# Altium footprint library IC.PcbLib: 386 footprints (part 18 of 30)
Each footprint in its own frame and in the unit in brackets; x right, y up, seen from the top. Pads: shape width x height; smd on the part's side, far side on the other; paste and mask are expansions set on the pad; w line width, h text height; cw(c..) or ccw(c..) is an arc to the next point about the centre after c.
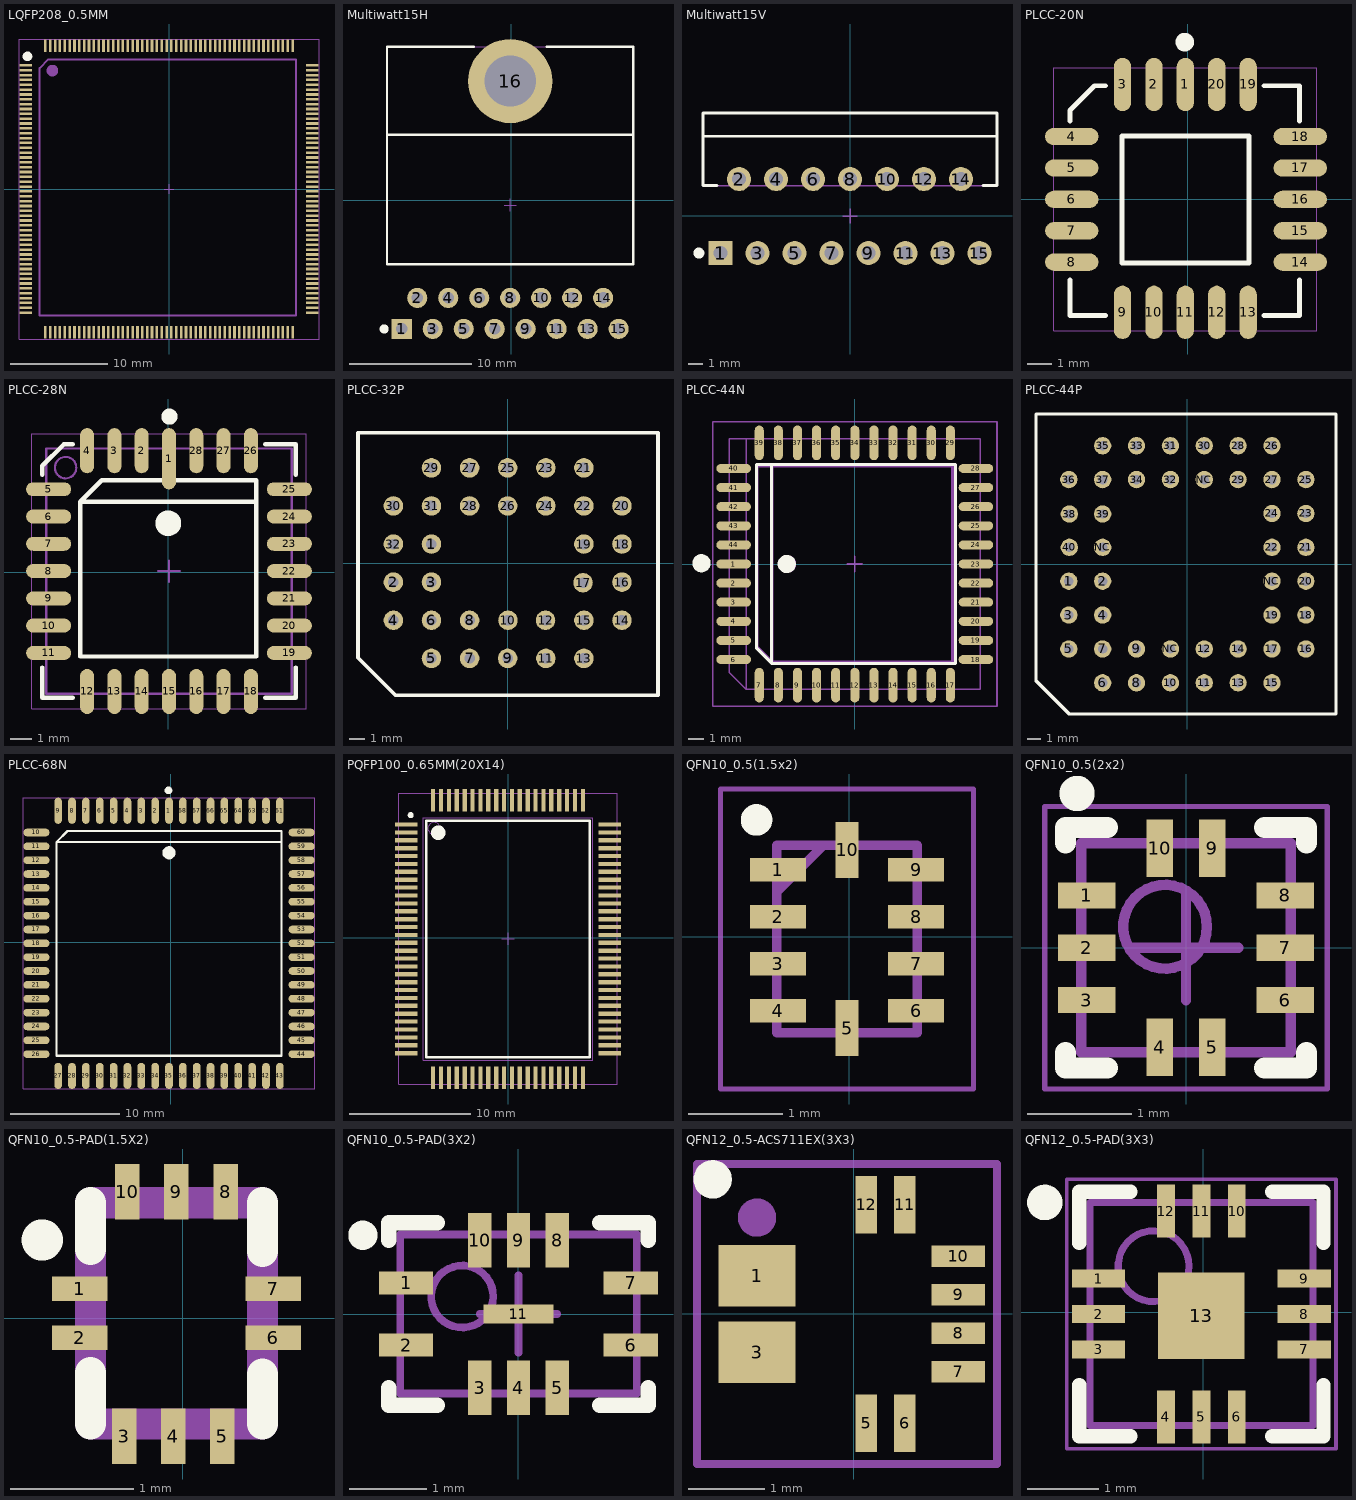
[diagram p17: the footprints below, top view; thin cyan lines are the x and y axes]

## LQFP208_0.5MM [mm]
height 0.254
pads (208):
  rect 1.3x0.27 smd: 1(-14.752,12.75) 2(-14.752,12.25) 3(-14.752,11.75) 4(-14.752,11.25) 5(-14.752,10.75) 6(-14.752,10.25) 7(-14.752,9.75) 8(-14.752,9.25) 9(-14.752,8.75) 10(-14.752,8.25) 11(-14.752,7.75) 12(-14.752,7.25) 13(-14.752,6.75) 14(-14.752,6.25) 15(-14.752,5.75) 16(-14.752,5.25) 17(-14.752,4.75) 18(-14.752,4.25) 19(-14.752,3.75) 20(-14.752,3.25) 21(-14.752,2.75) 22(-14.752,2.25) 23(-14.752,1.75) 24(-14.752,1.25) 25(-14.752,0.75) 26(-14.752,0.25) 27(-14.752,-0.25) 28(-14.752,-0.75) 29(-14.752,-1.25) 30(-14.752,-1.75) 31(-14.752,-2.25) 32(-14.752,-2.75) 33(-14.752,-3.25) 34(-14.752,-3.75) 35(-14.752,-4.25) 36(-14.752,-4.75) 37(-14.752,-5.25) 38(-14.752,-5.75) 39(-14.752,-6.25) 40(-14.752,-6.75) 41(-14.752,-7.25) 42(-14.752,-7.75) 43(-14.752,-8.25) 44(-14.752,-8.75) 45(-14.752,-9.25) 46(-14.752,-9.75) 47(-14.752,-10.25) 48(-14.752,-10.75) 49(-14.752,-11.25) 50(-14.752,-11.75) 51(-14.752,-12.25) 52(-14.752,-12.75) 105(14.752,-12.75) 106(14.752,-12.25) 107(14.752,-11.75) 108(14.752,-11.25) 109(14.752,-10.75) 110(14.752,-10.25) 111(14.752,-9.75) 112(14.752,-9.25) 113(14.752,-8.75) 114(14.752,-8.25) 115(14.752,-7.75) 116(14.752,-7.25) 117(14.752,-6.75) 118(14.752,-6.25) 119(14.752,-5.75) 120(14.752,-5.25) 121(14.752,-4.75) 122(14.752,-4.25) 123(14.752,-3.75) 124(14.752,-3.25) 125(14.752,-2.75) 126(14.752,-2.25) 127(14.752,-1.75) 128(14.752,-1.25) 129(14.752,-0.75) 130(14.752,-0.25) 131(14.752,0.25) 132(14.752,0.75) 133(14.752,1.25) 134(14.752,1.75) 135(14.752,2.25) 136(14.752,2.75) 137(14.752,3.25) 138(14.752,3.75) 139(14.752,4.25) 140(14.752,4.75) 141(14.752,5.25) 142(14.752,5.75) 143(14.752,6.25) 144(14.752,6.75) 145(14.752,7.25) 146(14.752,7.75) 147(14.752,8.25) 148(14.752,8.75) 149(14.752,9.25) 150(14.752,9.75) 151(14.752,10.25) 152(14.752,10.75) 153(14.752,11.25) 154(14.752,11.75) 155(14.752,12.25) 156(14.752,12.75)
  rect 0.27x1.3 smd: 53(-12.75,-14.752) 54(-12.25,-14.752) 55(-11.75,-14.752) 56(-11.25,-14.752) 57(-10.75,-14.752) 58(-10.25,-14.752) 59(-9.75,-14.752) 60(-9.25,-14.752) 61(-8.75,-14.752) 62(-8.25,-14.752) 63(-7.75,-14.752) 64(-7.25,-14.752) 65(-6.75,-14.752) 66(-6.25,-14.752) 67(-5.75,-14.752) 68(-5.25,-14.752) 69(-4.75,-14.752) 70(-4.25,-14.752) 71(-3.75,-14.752) 72(-3.25,-14.752) 73(-2.75,-14.752) 74(-2.25,-14.752) 75(-1.75,-14.752) 76(-1.25,-14.752) 77(-0.75,-14.752) 78(-0.25,-14.752) 79(0.25,-14.752) 80(0.75,-14.752) 81(1.25,-14.752) 82(1.75,-14.752) 83(2.25,-14.752) 84(2.75,-14.752) 85(3.25,-14.752) 86(3.75,-14.752) 87(4.25,-14.752) 88(4.75,-14.752) 89(5.25,-14.752) 90(5.75,-14.752) 91(6.25,-14.752) 92(6.75,-14.752) 93(7.25,-14.752) 94(7.75,-14.752) 95(8.25,-14.752) 96(8.75,-14.752) 97(9.25,-14.752) 98(9.75,-14.752) 99(10.25,-14.752) 100(10.75,-14.752) 101(11.25,-14.752) 102(11.75,-14.752) 103(12.25,-14.752) 104(12.75,-14.752) 157(12.75,14.752) 158(12.25,14.752) 159(11.75,14.752) 160(11.25,14.752) 161(10.75,14.752) 162(10.25,14.752) 163(9.75,14.752) 164(9.25,14.752) 165(8.75,14.752) 166(8.25,14.752) 167(7.75,14.752) 168(7.25,14.752) 169(6.75,14.752) 170(6.25,14.752) 171(5.75,14.752) 172(5.25,14.752) 173(4.75,14.752) 174(4.25,14.752) 175(3.75,14.752) 176(3.25,14.752) 177(2.75,14.752) 178(2.25,14.752) 179(1.75,14.752) 180(1.25,14.752) 181(0.75,14.752) 182(0.25,14.752) 183(-0.25,14.752) 184(-0.75,14.752) 185(-1.25,14.752) 186(-1.75,14.752) 187(-2.25,14.752) 188(-2.75,14.752) 189(-3.25,14.752) 190(-3.75,14.752) 191(-4.25,14.752) 192(-4.75,14.752) 193(-5.25,14.752) 194(-5.75,14.752) 195(-6.25,14.752) 196(-6.75,14.752) 197(-7.25,14.752) 198(-7.75,14.752) 199(-8.25,14.752) 200(-8.75,14.752) 201(-9.25,14.752) 202(-9.75,14.752) 203(-10.25,14.752) 204(-10.75,14.752) 205(-11.25,14.752) 206(-11.75,14.752) 207(-12.25,14.752) 208(-12.75,14.752)
Top Overlay:
  circle w0.5: c-14.6,13.678 r0.25
Mechanical 15:
  circle w0.6: c-12.023,12.206 r0.3
  lines w0.1: -0.5,0 0.5,0 ; 0,-0.5 0,0.5 ; -15.469,-15.469 15.469,-15.469 15.469,15.469 -15.469,15.469 -15.469,-15.469
  lines w0.2: -13.335,-13.056 13.081,-13.056 13.081,13.36 -12.441,13.36 -13.335,12.466 -13.335,-13.056
3D body "LQFP208-0.5mm.STEP": height 1.4, standoff 0, extent -14.75,-14.75 14.75,14.75

## Multiwatt15H [mm]
pads (16):
  rect 1.65x1.65 hole 0.95: 1(-8.992,-10.541)
  round 1.65 hole 0.95: 2(-7.722,-8.001) 3(-6.452,-10.541) 4(-5.182,-8.001) 5(-3.912,-10.541) 6(-2.642,-8.001) 7(-1.372,-10.541) 8(-0.102,-8.001) 9(1.168,-10.541) 10(2.438,-8.001) 11(3.708,-10.541) 12(4.978,-8.001) 13(6.248,-10.541) 14(7.518,-8.001) 15(8.788,-10.541)
  round 6.9 hole 4.2: 16(-0.102,9.779)
Top Overlay:
  circle w0.5: c-10.439,-10.541 r0.125
  lines w0.2: -10.202,5.379 9.998,5.379 ; -3.102,12.579 -10.202,12.579 -10.202,-5.221 9.998,-5.221 9.998,12.579 2.898,12.579
Mechanical 13:
  circle w0.1: c-0.102,9.779 r1.925
  lines w0.1: -10.202,5.379 9.998,5.379 ; -10.202,-5.221 9.998,-5.221 9.998,12.579 -10.202,12.579 -10.202,-5.221
Mechanical 15:
  lines w0.1: -0.602,-0.381 0.398,-0.381 ; -0.102,-0.881 -0.102,0.119
3D body "User Library-Multiwatt15H.step": height 5.1, standoff -1.4, extent -9.952,-10.82 9.648,12.78
3D body: height 1.6, standoff 0, extent -2.026,7.855 1.823,11.703

## Multiwatt15V [mm]
pads (15):
  rect 1.65x1.65 hole 0.95: 1(-8.89,-2.565)
  round 1.65 hole 0.95: 2(-7.62,2.515) 3(-6.35,-2.565) 4(-5.08,2.515) 5(-3.81,-2.565) 6(-2.54,2.515) 7(-1.27,-2.565) 8(0,2.515) 9(1.27,-2.565) 10(2.54,2.515) 11(3.81,-2.565) 12(5.08,2.515) 13(6.35,-2.565) 14(7.62,2.515) 15(8.89,-2.565)
Top Overlay:
  circle w0.5: c-10.389,-2.565 r0.125
  lines w0.2: -10.1,5.465 10.1,5.465 ; -9.144,2.065 -10.1,2.065 -10.1,7.065 10.1,7.065 10.1,2.065 9.144,2.065
Mechanical 13:
  lines w0.1: -10.1,5.465 10.1,5.465 ; -10.1,2.065 -10.1,7.065 10.1,7.065 10.1,2.065 -10.1,2.065
Mechanical 15:
  lines w0.1: -0.5,-0.025 0.5,-0.025 ; 0,-0.525 0,0.475
3D body "User Library-Multiwatt15V.step": height 21, standoff -1.3, extent -9.779,-2.794 9.821,7.096

## PLCC-20N [mil] "PLCC, 44-Leads, Body 17.6x17.6mm (max), Pitch 1.270mm, IPC Medium Density"
height 177.17
pads (20):
  rrect100% 27.56x84.96 smd: 1(-4,182.5) 2(-54,182.5) 3(-104,182.5) 9(-104,-180.5) 10(-54,-180.5) 11(-4,-180.5) 12(46,-180.5) 13(96,-180.5) 19(96,182.5) 20(46,182.5)
  rrect100% 84.96x27.56 smd: 4(-185,99.5) 5(-185,49.5) 6(-185,-0.5) 7(-185,-50.5) 8(-185,-100.5) 14(179,-100.5) 15(179,-50.5) 16(179,-0.5) 17(179,49.5) 18(179,99.5)
Top Overlay:
  circle w19.68: c-5,250 r4.92
  lines w7.87: -188.07,-129.16 -188.07,-185.65 -131.57,-185.65 ; -188.07,123.99 -188.07,141.12 -148.7,180.49 -131.57,180.49 ; 121.57,-185.65 178.07,-185.65 178.07,-129.16 ; 121.57,180.49 178.07,180.49 178.07,123.99 ; -105.1,-101.6 -105.1,100.6 97.1,100.6 97.1,-101.6 -105.1,-101.6
Mechanical 15:
  lines w1.97: -213.65,-210.15 -213.65,209.15 205.65,209.15 205.65,-210.15 -213.65,-210.15
3D body "User Library-PLCC-20.step": height 190.55, standoff 3.15, extent -200.84,-198 192.85,195.7

## PLCC-28N [mm]
height 4.5
pads (28):
  oval 0.65x2.85 smd: 1(0.034,5.28)
  oval 0.65x2.1 smd: 2(-1.236,5.655) 3(-2.506,5.655) 4(-3.776,5.655) 12(-3.776,-5.554) 13(-2.506,-5.554) 14(-1.236,-5.554) 15(0.034,-5.554) 16(1.304,-5.554) 17(2.574,-5.554) 18(3.844,-5.554) 26(3.844,5.655) 27(2.574,5.655) 28(1.304,5.655)
  oval 2.1x0.65 smd: 5(-5.57,3.861) 6(-5.57,2.591) 7(-5.57,1.321) 8(-5.57,0.051) 9(-5.57,-1.219) 10(-5.57,-2.489) 11(-5.57,-3.759) 19(5.639,-3.759) 20(5.639,-2.489) 21(5.639,-1.219) 22(5.639,0.051) 23(5.639,1.321) 24(5.639,2.591) 25(5.639,3.861)
Top Overlay:
  circle w0.5: c0.051,7.239 r0.125
  circle w0.6: c0,2.278 r0.3
  lines w0.2: -5.866,-4.434 -5.866,-5.849 -4.451,-5.849 ; -5.866,4.536 -5.866,4.951 -4.866,5.951 -4.451,5.951 ; 4.1,3.278 -4.1,3.278 ; 4.519,-5.849 5.934,-5.849 5.934,-4.434 ; 4.519,5.951 5.934,5.951 5.934,4.536 ; -4.1,3.278 -4.1,-3.922 4.1,-3.922 4.1,4.278 -3.1,4.278 -4.1,3.278
Mechanical 13:
  circle w0.1: c-4.781,4.866 r0.5
  lines w0.1: -5.681,-5.664 5.749,-5.664 5.749,5.766 -5.681,5.766 -5.681,-5.664
Mechanical 15:
  lines w0.05: -6.366,-6.349 6.434,-6.349 6.434,6.451 -6.366,6.451 -6.366,-6.349
  lines w0.1: -0.466,0.051 0.534,0.051 ; 0.034,-0.449 0.034,0.551
3D body "User Library-PLCC28.STEP": height 4.5, standoff 0, extent -6.21,-6.147 6.109,6.172

## PLCC-32P [mm]
pads (32):
  round 1.3 hole 0.7: 1(-5.08,1.27) 2(-7.62,-1.27) 3(-5.08,-1.27) 4(-7.62,-3.81) 5(-5.08,-6.35) 6(-5.08,-3.81) 7(-2.54,-6.35) 8(-2.54,-3.81) 9(0,-6.35) 10(0.02,-3.81) 11(2.54,-6.35) 12(2.52,-3.81) 13(5.08,-6.35) 14(7.62,-3.81) 15(5.08,-3.81) 16(7.62,-1.27) 17(5.02,-1.31) 18(7.62,1.27) 19(5.08,1.27) 20(7.62,3.81) 21(5.08,6.35) 22(5.08,3.81) 23(2.54,6.35) 24(2.54,3.81) 25(0,6.35) 26(0,3.81) 27(-2.54,6.35) 28(-2.54,3.81) 29(-5.08,6.35) 30(-7.62,3.81) 31(-5.08,3.81) 32(-7.62,1.27)
Top Overlay:
  lines w0.254: -9.98,-6.31 -9.98,-3.81 -9.98,8.69 10.02,8.69 10.02,-8.81 -4.98,-8.81 -7.48,-8.81 -9.98,-6.31
3D body "PLCC 32W.STEP": height 6.8, standoff -4.88, extent -9.904,-8.659 10.006,8.711

## PLCC-44N [mm] "PLCC, 44-Leads, Body 17.6x17.6mm (max), Pitch 1.270mm, IPC Medium Density"
height 4.5
pads (44):
  oval 2.3x0.6 smd: 1(-8.05,0) 2(-8.05,-1.27) 3(-8.05,-2.54) 4(-8.05,-3.81) 5(-8.05,-5.08) 6(-8.05,-6.35) 18(8.05,-6.35) 19(8.05,-5.08) 20(8.05,-3.81) 21(8.05,-2.54) 22(8.05,-1.27) 23(8.05,0) 24(8.05,1.27) 25(8.05,2.54) 26(8.05,3.81) 27(8.05,5.08) 28(8.05,6.35) 40(-8.05,6.35) 41(-8.05,5.08) 42(-8.05,3.81) 43(-8.05,2.54) 44(-8.05,1.27)
  oval 0.6x2.3 smd: 7(-6.35,-8.05) 8(-5.08,-8.05) 9(-3.81,-8.05) 10(-2.54,-8.05) 11(-1.27,-8.05) 12(0,-8.05) 13(1.27,-8.05) 14(2.54,-8.05) 15(3.81,-8.05) 16(5.08,-8.05) 17(6.35,-8.05) 29(6.35,8.05) 30(5.08,8.05) 31(3.81,8.05) 32(2.54,8.05) 33(1.27,8.05) 34(0,8.05) 35(-1.27,8.05) 36(-2.54,8.05) 37(-3.81,8.05) 38(-5.08,8.05) 39(-6.35,8.05)
Top Overlay:
  circle w0.6: c-4.524,0 r0.3
  circle w0.6: c-10.188,0.051 r0.3
  lines w0.2: -5.524,6.6 -5.524,-6.6 ; -5.524,-6.6 6.676,-6.6 6.676,6.6 -6.524,6.6 -6.524,-5.6 -5.524,-6.6
Mechanical 13:
  lines w0.1: -7.23,8.33 -7.23,-8.33 ; -7.23,-8.33 8.33,-8.33 8.33,8.33 -8.33,8.33 -8.33,-7.23 -7.23,-8.33
Mechanical 15:
  circle w0.6: c-4.5,0 r0.3
  lines w0.1: -0.5,0 0.5,0 ; 0,-0.5 0,0.5 ; -9.45,-9.45 9.45,-9.45 9.45,9.45 -9.45,9.45 -9.45,-9.45
  lines w0.2: -5.5,6.5 -5.5,-6.5 ; -5.5,-6.5 -6.5,-5.5 -6.5,6.5 6.5,6.5 6.5,-6.5 -5.5,-6.5
3D body "User Library-plcc-44p1658x1658ls127h439.step": height 4.39, standoff 0, extent -8.813,-8.686 8.712,8.839

## PLCC-44P [mm]
pads (44):
  round 1.3 hole 0.7: 1(-8.89,-1.27) 2(-6.35,-1.27) 3(-8.89,-3.81) 4(-6.35,-3.81) 5(-8.89,-6.35) 6(-6.35,-8.89) 7(-6.35,-6.35) 8(-3.81,-8.89) 9(-3.81,-6.35) 10(-1.27,-8.89) 11(1.27,-8.89) 12(1.27,-6.35) 13(3.81,-8.89) 14(3.81,-6.35) 15(6.35,-8.89) 16(8.89,-6.35) 17(6.35,-6.35) 18(8.89,-3.81) 19(6.35,-3.81) 20(8.89,-1.27) 21(8.89,1.27) 22(6.35,1.27) 23(8.89,3.81) 24(6.35,3.81) 25(8.89,6.35) 26(6.35,8.89) 27(6.35,6.35) 28(3.81,8.89) 29(3.81,6.35) 30(1.27,8.89) 31(-1.27,8.89) 32(-1.27,6.35) 33(-3.81,8.89) 34(-3.81,6.35) 35(-6.35,8.89) 36(-8.89,6.35) 37(-6.35,6.35) 38(-8.85,3.77) 39(-6.35,3.77) 40(-8.85,1.27) NC(-6.35,1.27) NC(-1.27,-6.35) NC(1.27,6.35) NC(6.35,-1.27)
Top Overlay:
  lines w0.254: -11.35,-8.73 -11.35,-6.23 -11.35,11.27 11.15,11.27 11.15,-11.23 -6.35,-11.23 -8.85,-11.23 -11.35,-8.73
3D body "a-ccs_044-z-t.stp": height 8, standoff -3.35, extent -11.786,-11.699 11.714,11.801

## PLCC-68N [mm]
height 4.5
pads (68):
  oval 0.7x2.4 smd: 1(-0.152,12.078) 2(-1.422,12.078) 3(-2.692,12.078) 4(-3.962,12.078) 5(-5.232,12.078) 6(-6.502,12.078) 7(-7.772,12.078) 8(-9.042,12.078) 9(-10.312,12.078) 27(-10.312,-12.23) 28(-9.042,-12.23) 29(-7.772,-12.23) 30(-6.502,-12.23) 31(-5.232,-12.23) 32(-3.962,-12.23) 33(-2.692,-12.23) 34(-1.422,-12.23) 35(-0.152,-12.23) 36(1.118,-12.23) 37(2.388,-12.23) 38(3.658,-12.23) 39(4.928,-12.23) 40(6.198,-12.23) 41(7.468,-12.23) 42(8.738,-12.23) 43(10.008,-12.23) 61(10.008,12.078) 62(8.738,12.078) 63(7.468,12.078) 64(6.198,12.078) 65(4.928,12.078) 66(3.658,12.078) 67(2.388,12.078) 68(1.118,12.078)
  oval 2.4x0.7 smd: 10(-12.306,10.084) 11(-12.306,8.814) 12(-12.306,7.544) 13(-12.306,6.274) 14(-12.306,5.004) 15(-12.306,3.734) 16(-12.306,2.464) 17(-12.306,1.194) 18(-12.306,-0.076) 19(-12.306,-1.346) 20(-12.306,-2.616) 21(-12.306,-3.886) 22(-12.306,-5.156) 23(-12.306,-6.426) 24(-12.306,-7.696) 25(-12.306,-8.966) 26(-12.306,-10.236) 44(12.002,-10.236) 45(12.002,-8.966) 46(12.002,-7.696) 47(12.002,-6.426) 48(12.002,-5.156) 49(12.002,-3.886) 50(12.002,-2.616) 51(12.002,-1.346) 52(12.002,-0.076) 53(12.002,1.194) 54(12.002,2.464) 55(12.002,3.734) 56(12.002,5.004) 57(12.002,6.274) 58(12.002,7.544) 59(12.002,8.814) 60(12.002,10.084)
Top Overlay:
  circle w0.6: c-0.152,8.224 r0.3
  circle w0.45: c-0.203,13.945 r0.125
  lines w0.2: 10.148,9.224 -10.452,9.224 ; -10.452,9.224 -10.452,-10.376 10.148,-10.376 10.148,10.224 -9.452,10.224 -10.452,9.224
Mechanical 15:
  lines w0.05: -13.502,-13.426 13.198,-13.426 13.198,13.274 -13.502,13.274 -13.502,-13.426
3D body "User Library-8051 MCU PLCC 68-pin package (1).step": height 4.38, standoff 0, extent -12.751,-12.7 12.395,12.446

## PQFP100_0.65MM(20X14) [mm]
pads (100):
  rect 1.85x0.35 smd: 1(-8.406,9.349) 2(-8.406,8.699) 3(-8.406,8.049) 4(-8.406,7.399) 5(-8.406,6.749) 6(-8.406,6.099) 7(-8.406,5.449) 8(-8.406,4.799) 9(-8.406,4.149) 10(-8.406,3.499) 11(-8.406,2.849) 12(-8.406,2.199) 13(-8.406,1.549) 14(-8.406,0.899) 15(-8.406,0.249) 16(-8.406,-0.401) 17(-8.406,-1.051) 18(-8.406,-1.701) 19(-8.406,-2.351) 20(-8.406,-3.001) 21(-8.406,-3.651) 22(-8.406,-4.301) 23(-8.406,-4.951) 24(-8.406,-5.601) 25(-8.406,-6.251) 26(-8.406,-6.901) 27(-8.406,-7.551) 28(-8.406,-8.201) 29(-8.406,-8.851) 30(-8.406,-9.501) 51(8.406,-9.501) 52(8.406,-8.851) 53(8.406,-8.201) 54(8.406,-7.551) 55(8.406,-6.901) 56(8.406,-6.251) 57(8.406,-5.601) 58(8.406,-4.951) 59(8.406,-4.301) 60(8.406,-3.651) 61(8.406,-3.001) 62(8.406,-2.351) 63(8.406,-1.701) 64(8.406,-1.051) 65(8.406,-0.401) 66(8.406,0.249) 67(8.406,0.899) 68(8.406,1.549) 69(8.406,2.199) 70(8.406,2.849) 71(8.406,3.499) 72(8.406,4.149) 73(8.406,4.799) 74(8.406,5.449) 75(8.406,6.099) 76(8.406,6.749) 77(8.406,7.399) 78(8.406,8.049) 79(8.406,8.699) 80(8.406,9.349)
  rect 0.35x1.85 smd: 31(-6.175,-11.533) 32(-5.525,-11.533) 33(-4.875,-11.533) 34(-4.225,-11.533) 35(-3.575,-11.533) 36(-2.925,-11.533) 37(-2.275,-11.533) 38(-1.625,-11.533) 39(-0.975,-11.533) 40(-0.325,-11.533) 41(0.325,-11.533) 42(0.975,-11.533) 43(1.625,-11.533) 44(2.275,-11.533) 45(2.925,-11.533) 46(3.575,-11.533) 47(4.225,-11.533) 48(4.875,-11.533) 49(5.525,-11.533) 50(6.175,-11.533) 81(6.175,11.355) 82(5.525,11.355) 83(4.875,11.355) 84(4.225,11.355) 85(3.575,11.355) 86(2.925,11.355) 87(2.275,11.355) 88(1.625,11.355) 89(0.975,11.355) 90(0.325,11.355) 91(-0.325,11.355) 92(-0.975,11.355) 93(-1.625,11.355) 94(-2.275,11.355) 95(-2.925,11.355) 96(-3.575,11.355) 97(-4.225,11.355) 98(-4.875,11.355) 99(-5.525,11.355) 100(-6.175,11.355)
Top Overlay:
  circle w0.25: c-8.025,10.124 r0.125
  circle w0.6: c-5.75,8.674 r0.3
  lines w0.2: -6.75,-9.826 -6.75,9.674 6.75,9.674 6.75,-9.826 -6.75,-9.826
Mechanical 13:
  circle w0.1: c-6.1,9.024 r0.5
  lines w0.1: -7,-10.076 -7,9.924 7,9.924 7,-10.076 -7,-10.076
Mechanical 15:
  lines w0.05: -9,-12.076 -9,11.924 9,11.924 9,-12.076 -9,-12.076
  lines w0.1: -0.5,-0.076 0.5,-0.076 ; 0,-0.576 0,0.424
3D body "User Library-QFP-100.STEP": height 3.45, standoff -0.08, extent -8.6,-11.659 8.6,11.541

## QFN10_0.5(1.5x2) [mm]
height 0.254
pads (10):
  rect 0.6x0.25 smd: 1(-0.762,0.711) 2(-0.762,0.211) 3(-0.762,-0.289) 4(-0.762,-0.789) 6(0.711,-0.789) 7(0.711,-0.289) 8(0.711,0.211) 9(0.711,0.711)
  rect 0.25x0.6 smd: 5(-0.025,-0.975) 10(-0.025,0.925)
Top Overlay:
  circle w0.25: c-0.991,1.245 r0.043
Mechanical 13:
  lines w0.1: -0.775,0.475 -0.275,0.975 ; -0.775,-1.025 -0.775,0.975 0.725,0.975 0.725,-1.025 -0.775,-1.025
Mechanical 15:
  lines w0.05: -1.375,-1.625 -1.375,1.575 1.325,1.575 1.325,-1.625 -1.375,-1.625
3D body "TS5A23159RSER.stp": height 0.6, standoff 0, extent -0.825,-1.075 0.775,1.025

## QFN10_0.5(2x2) [mm]
height 0.254
pads (10):
  rect 0.55x0.25 smd: 1(-0.95,0.5) 2(-0.95,0) 3(-0.95,-0.5) 6(0.95,-0.5) 7(0.95,0) 8(0.95,0.5)
  rect 0.25x0.55 smd: 4(-0.25,-0.95) 5(0.25,-0.95) 9(0.25,0.95) 10(-0.25,0.95)
Top Overlay:
  circle w0.25: c-1.041,1.473 r0.043
  lines w0.2: -1.15,-1 -1.15,-1.15 -0.75,-1.15 ; -1.15,1 -1.15,1.15 -0.75,1.15 ; 0.75,-1.15 1.15,-1.15 1.15,-1 ; 0.75,1.15 1.15,1.15 1.15,1
Mechanical 13:
  circle w0.1: c-0.2,0.2 r0.4
  lines w0.1: -1,-1 -1,1 1,1 1,-1 -1,-1
Mechanical 15:
  lines w0.05: -1.35,-1.35 -1.35,1.35 1.35,1.35 1.35,-1.35 -1.35,-1.35
  lines w0.1: -0.5,0 0.5,0 ; 0,-0.5 0,0.5
3D body: height 0.6, standoff 0, extent -1,-1 1,1
3D body: height 0.62, standoff 0.4, extent -0.861,0.508 -0.562,0.807

## QFN10_0.5-PAD(1.5X2) [mm]
height 0.254
pads (10):
  rect 0.45x0.2 smd: 1(-0.838,0.238) 2(-0.838,-0.162) 6(0.737,-0.162) 7(0.737,0.238)
  rect 0.2x0.45 smd: 3(-0.476,-0.964) 4(-0.076,-0.964) 5(0.324,-0.964) 8(0.349,1.029) 9(-0.051,1.029) 10(-0.451,1.029)
Top Overlay:
  circle w0.254: c-1.143,0.635 r0.041
  lines w0.254: -0.751,-0.862 -0.751,-0.446 ; -0.751,0.559 -0.751,0.938 ; 0.649,-0.862 0.649,-0.458 ; 0.649,0.542 0.649,0.938
Mechanical 13:
  lines w0.254: -0.751,-0.862 -0.751,0.938 0.649,0.938 0.649,-0.862 -0.751,-0.862
3D body: height 0.6, standoff 0, extent -0.762,-0.889 0.635,1.016
3D body: height 0.62, standoff 0.4, extent -0.581,0.356 -0.282,0.655

## QFN10_0.5-PAD(3X2) [mm]
height 0.254
pads (11):
  rect 0.7x0.3 smd: 1(-1.45,0.4) 2(-1.45,-0.4) 6(1.45,-0.4) 7(1.45,0.4)
  rect 0.3x0.7 smd: 3(-0.5,-0.95) 4(0,-0.95) 5(0.5,-0.95) 8(0.5,0.95) 9(0,0.95) 10(-0.5,0.95)
  rect 0.9x0.25 smd: 11(0,0)
Top Overlay:
  circle w0.25: c-2.007,1.016 r0.063
  lines w0.2: -1.675,-0.95 -1.675,-1.175 -1.05,-1.175 ; -1.675,0.95 -1.675,1.175 -1.05,1.175 ; 1.05,-1.175 1.675,-1.175 1.675,-0.95 ; 1.05,1.175 1.675,1.175 1.675,0.95
Mechanical 13:
  circle w0.1: c-0.725,0.225 r0.4
  lines w0.1: -1.525,-1.025 1.525,-1.025 1.525,1.025 -1.525,1.025 -1.525,-1.025
Mechanical 15:
  lines w0.1: -0.5,0 0.5,0 ; 0,-0.5 0,0.5
3D body: height 0.8, standoff 0, extent -1.525,-1.025 1.525,1.025
3D body: height 0.82, standoff 0.4, extent -1.342,0.562 -1.044,0.861

## QFN12_0.5-ACS711EX(3X3) [mm]
pads (10):
  rect 1x0.8 smd paste-2 mask+0.076: 1(-1.26,0.5) 3(-1.26,-0.5)
  rect 0.28x0.75 smd mask+0.076: 5(0.163,-1.425) 6(0.663,-1.425) 11(0.663,1.425) 12(0.163,1.425)
  rect 0.7x0.28 smd mask+0.051: 7(1.363,-0.75) 8(1.363,-0.25) 9(1.363,0.25) 10(1.363,0.75)
Top Overlay:
  circle w0.25: c-1.839,1.755 r0.125
Top Paste:
  lines w0.1: -1.666,-0.723 -1.067,-0.723 ; -1.666,-0.652 -0.998,-0.652 -0.963,-0.617 -0.963,-0.368 -1.135,-0.195 ; -1.666,-0.348 -0.998,-0.348 ; -1.666,-0.277 -1.067,-0.277 ; -1.666,0.277 -1.067,0.277 ; -1.666,0.348 -0.998,0.348 -0.963,0.383 -0.963,0.632 -1.135,0.805 ; -1.666,0.652 -0.998,0.652 ; -1.666,0.723 -1.067,0.723 ; -1.659,-0.424 -0.965,-0.424 ; -1.659,0.576 -0.965,0.576 ; -1.656,-0.5 -0.968,-0.5 ; -1.656,0.5 -0.968,0.5 ; -0.973,-0.576 -1.661,-0.576 -0.968,-0.576 ; -0.973,0.424 -1.661,0.424 -0.968,0.424 ; -0.963,-0.632 -1.135,-0.805 -1.666,-0.805 -1.666,-0.195 ; -0.963,0.368 -1.135,0.195 -1.666,0.195 -1.666,0.805 ; -1.666,-0.195 -1.135,-0.195 ; -1.666,-0.195 -1.135,-0.195 ; -1.666,0.805 -1.135,0.805 ; -1.666,0.805 -1.135,0.805
Mechanical 15:
  circle w0.25: c-1.26,1.257 r0.125
  lines w0.1: -2.043,-1.956 -2.043,1.956 1.868,1.956 1.868,-1.956 -2.043,-1.956
3D body: height 0.82, standoff 0.4, extent -1.215,1.044 -0.917,1.344
3D body: height 0.8, standoff 0, extent -1.452,-1.551 1.402,1.499

## QFN12_0.5-PAD(3X3) [mm]
height 0.254
pads (13):
  rect 0.75x0.25 smd: 1(-1.477,0.475) 2(-1.477,-0.025) 3(-1.477,-0.525) 7(1.427,-0.525) 8(1.427,-0.025) 9(1.427,0.475)
  rect 0.25x0.75 smd: 4(-0.525,-1.477) 5(-0.025,-1.477) 6(0.475,-1.477) 10(0.475,1.427) 11(-0.025,1.427) 12(-0.525,1.427)
  rect 1.219x1.219 smd: 13(-0.025,-0.051)
Top Overlay:
  circle w0.25: c-2.235,1.549 r0.125
  lines w0.2: -1.75,-1.025 -1.75,-1.75 -1.025,-1.75 ; -1.75,0.975 -1.75,1.7 -1.025,1.7 ; 0.975,-1.75 1.7,-1.75 1.7,-1.025 ; 0.975,1.7 1.7,1.7 1.7,0.975
Mechanical 13:
  circle w0.1: c-0.7,0.65 r0.5
  lines w0.1: -1.6,-1.6 -1.6,1.55 1.55,1.55 1.55,-1.6 -1.6,-1.6
Mechanical 15:
  lines w0.05: -1.925,-1.925 -1.925,1.875 1.875,1.875 1.875,-1.925 -1.925,-1.925
  lines w0.1: -0.525,-0.025 0.475,-0.025 ; -0.025,-0.525 -0.025,0.475
3D body "User Library-QFN12_3x3x0_8.step": height 0.78, standoff -0.02, extent -1.536,-1.536 1.484,1.484